# Altium footprint library mechanical.PcbLib: 44 footprints (part 2 of 3)
Each footprint in its own frame and in the unit in brackets; x right, y up, seen from the top. Pads: shape width x height; smd on the part's side, far side on the other; paste and mask are expansions set on the pad; w line width, h text height; cw(c..) or ccw(c..) is an arc to the next point about the centre after c.
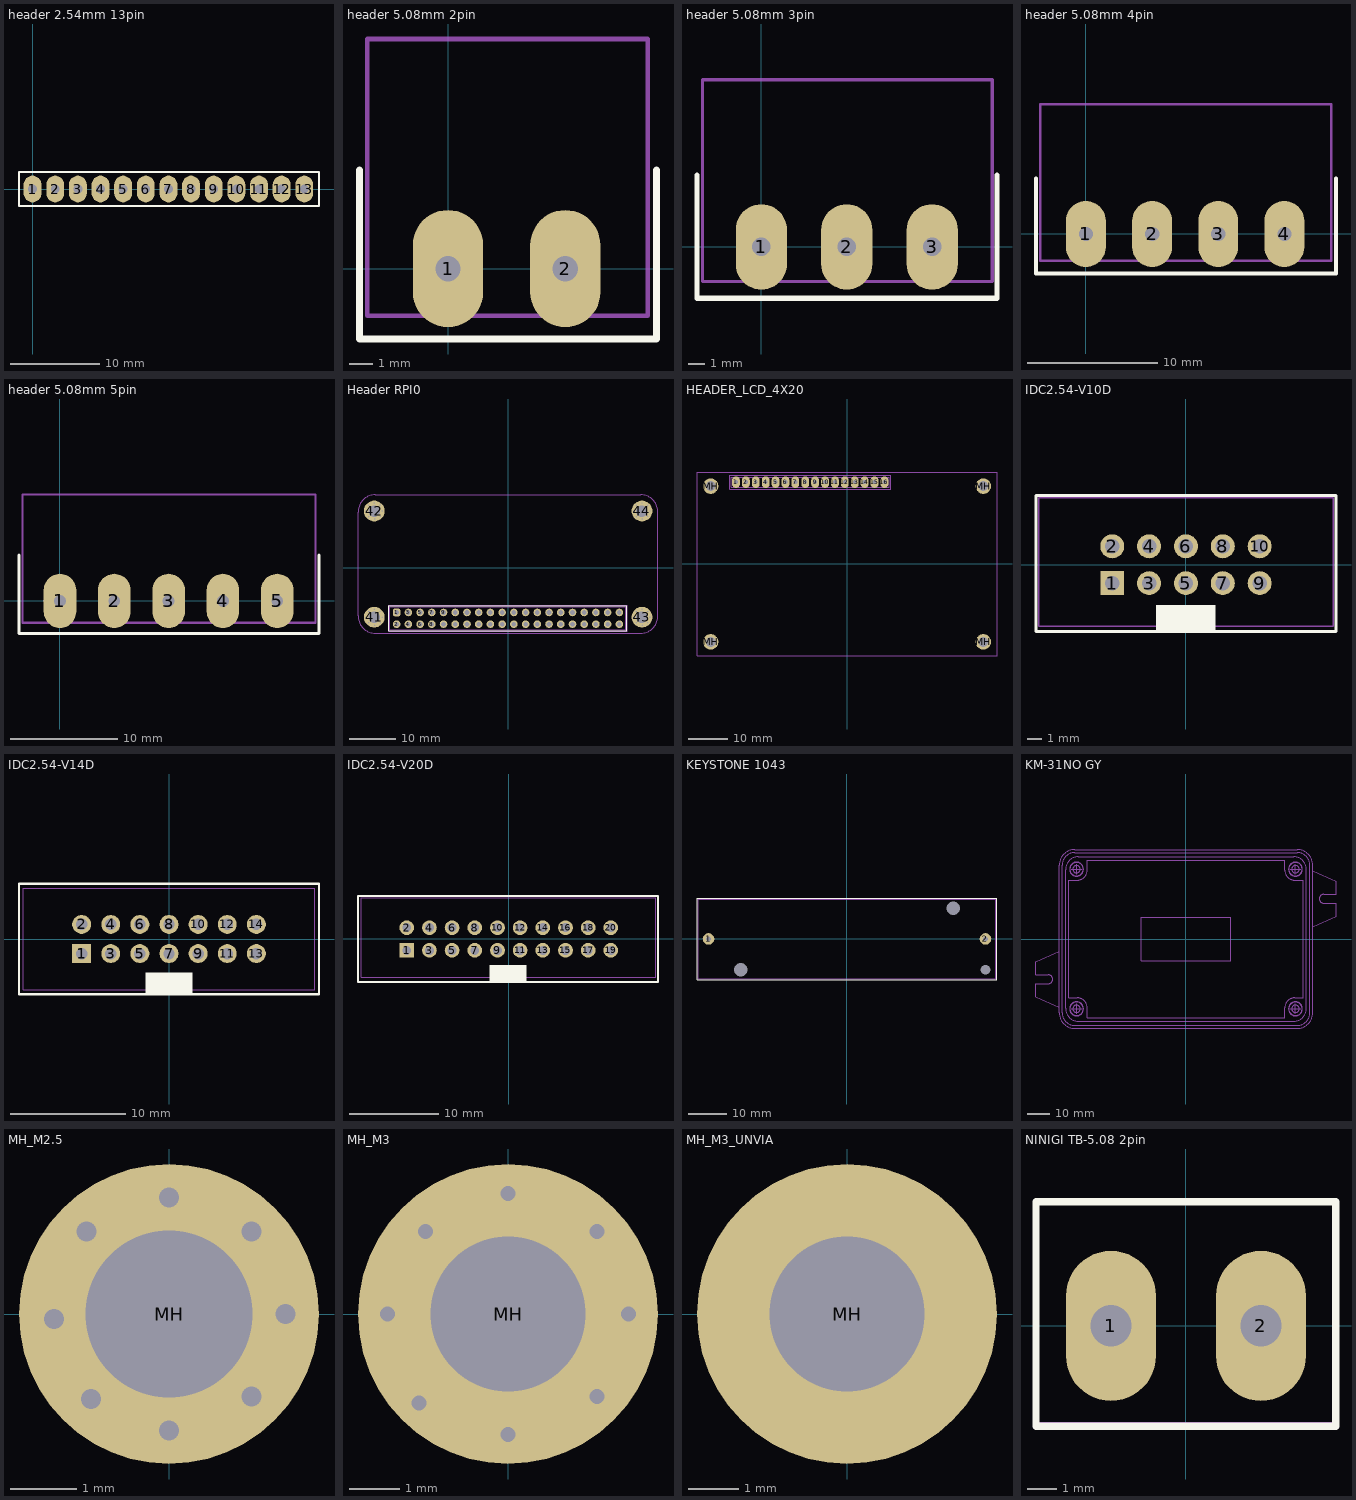
[diagram p1: the footprints below, top view; thin cyan lines are the x and y axes]

## header 2.54mm 13pin [mm]
pads (13):
  oval 2x3 hole 1: 1(0,0) 2(2.54,0) 3(5.08,0) 4(7.62,0) 5(10.16,0) 6(12.7,0) 7(15.24,0) 8(17.78,0) 9(20.32,0) 10(22.86,0) 11(25.4,0) 12(27.94,0) 13(30.48,0)
Top Overlay:
  lines w0.2: -1.524,-1.905 -1.524,1.905 32.131,1.905 32.131,-1.905 -1.524,-1.905
3D body: height 10, standoff 0, extent 29.984,-0.499 30.98,0.499
3D body: height 10, standoff 0, extent 27.444,-0.499 28.44,0.499
3D body: height 10, standoff 0, extent 24.904,-0.499 25.9,0.499
3D body: height 3, standoff 0, extent 27.305,-1.143 30.861,1.143
3D body: height 3, standoff 0, extent 25.019,-1.143 28.575,1.143
3D body: height 3, standoff 0, extent 22.225,-1.143 25.781,1.143
3D body: height 3, standoff 0, extent 29.337,-1.778 31.623,1.778
3D body: height 3, standoff 0, extent 26.797,-1.778 29.083,1.778
3D body: height 3, standoff 0, extent 24.257,-1.778 26.543,1.778
3D body: height 3, standoff 0, extent 9.525,-1.143 13.081,1.143
3D body: height 10, standoff 0, extent 12.204,-0.499 13.2,0.499
3D body: height 10, standoff 0, extent 14.744,-0.499 15.74,0.499
3D body: height 10, standoff 0, extent 17.284,-0.499 18.28,0.499
3D body: height 10, standoff 0, extent 19.824,-0.499 20.82,0.499
3D body: height 10, standoff 0, extent 22.364,-0.499 23.36,0.499
3D body: height 3, standoff 0, extent 11.557,-1.778 13.843,1.778
3D body: height 3, standoff 0, extent 14.097,-1.778 16.383,1.778
3D body: height 3, standoff 0, extent 16.637,-1.778 18.923,1.778
3D body: height 3, standoff 0, extent 19.177,-1.778 21.463,1.778
3D body: height 3, standoff 0, extent 21.717,-1.778 24.003,1.778
3D body: height 3, standoff 0, extent 12.319,-1.143 15.875,1.143
3D body: height 3, standoff 0, extent 14.605,-1.143 18.161,1.143
3D body: height 3, standoff 0, extent 17.399,-1.143 20.955,1.143
3D body: height 3, standoff 0, extent 19.685,-1.143 23.241,1.143
3D body: height 10, standoff 0, extent -0.496,-0.499 0.5,0.499
3D body: height 10, standoff 0, extent 2.044,-0.499 3.04,0.499
3D body: height 10, standoff 0, extent 4.584,-0.499 5.58,0.499
3D body: height 10, standoff 0, extent 7.124,-0.499 8.12,0.499
3D body: height 10, standoff 0, extent 9.664,-0.499 10.66,0.499
3D body: height 3, standoff 0, extent -1.143,-1.778 1.143,1.778
3D body: height 3, standoff 0, extent 1.397,-1.778 3.683,1.778
3D body: height 3, standoff 0, extent 3.937,-1.778 6.223,1.778
3D body: height 3, standoff 0, extent 6.477,-1.778 8.763,1.778
3D body: height 3, standoff 0, extent 9.017,-1.778 11.303,1.778
3D body: height 3, standoff 0, extent -0.381,-1.143 3.175,1.143
3D body: height 3, standoff 0, extent 1.905,-1.143 5.461,1.143
3D body: height 3, standoff 0, extent 4.699,-1.143 8.255,1.143
3D body: height 3, standoff 0, extent 6.985,-1.143 10.541,1.143

## header 5.08mm 2pin [mm]
height 7.8
pads (2):
  oval 3.048x5.08 hole 1.1: 1(0,0) 2(5.08,0)
Top Overlay:
  lines w0.3: -3.833,4.275 -3.833,-3.05 9.03,-3.05 9.03,4.275
Mechanical 13:
  lines w0.2: -3.503,-2.05 8.657,-2.05 8.657,9.95 -3.503,9.95 -3.503,-2.05
3D body "User Library-TB5_08-2R.step": height 8.55, standoff -4.1, extent -3.503,-2.05 8.657,9.95

## header 5.08mm 3pin [mm]
height 7.8
pads (3):
  oval 3.048x5.08 hole 1.1: 1(0,0) 2(5.08,0) 3(10.16,0)
Top Overlay:
  lines w0.254: -1.4,0 0,0 ; 10.16,0 11.56,0
  lines w0.3: -3.833,4.275 -3.833,-3.05 14.017,-3.05 14.017,4.275
Mechanical 13:
  lines w0.2: -3.503,-2.05 13.737,-2.05 13.737,9.95 -3.503,9.95 -3.503,-2.05
3D body "User Library-TB5_08-3R.step": height 8.55, standoff -4.1, extent -3.503,-2.05 13.737,9.95

## header 5.08mm 4pin [mm]
height 7.8
pads (4):
  oval 3.048x5.08 hole 1.1: 1(0,0) 2(5.08,0) 3(10.16,0) 4(15.24,0)
Top Overlay:
  lines w0.254: -1.4,0 0,0 ; 10.16,0 11.56,0
  lines w0.3: -3.833,4.275 -3.833,-3.05 19.2,-3.05 19.2,4.275
Mechanical 13:
  lines w0.2: -3.503,-2.05 -3.503,9.95 18.825,9.95 18.825,-2.05 -3.503,-2.05
3D body "User Library-TB5_08-4R.step": height 8.55, standoff -4.1, extent -3.503,-2.05 18.817,9.95

## header 5.08mm 5pin [mm]
height 7.8
pads (5):
  oval 3.048x5.08 hole 1.1: 1(0,0) 2(5.08,0) 3(10.16,0) 4(15.24,0) 5(20.32,0)
Top Overlay:
  lines w0.254: -1.4,0 0,0 ; 10.16,0 11.56,0
  lines w0.3: -3.833,4.275 -3.833,-3.05 24.225,-3.05 24.225,4.275
Mechanical 13:
  lines w0.2: -3.503,-2.05 23.897,-2.05 23.897,9.95 -3.503,9.95 -3.503,-2.05
3D body "User Library-TB5_08-5R.step": height 8.55, standoff -4.1, extent -3.503,-2.05 23.897,9.95

## Header RPI0 [mm]
height 9.45
pads (44):
  rrect50% 1.65x1.65 hole 1: 1(-24.153,-9.717)
  round 1.65 hole 1: 2(-24.153,-12.257) 3(-21.613,-9.717) 4(-21.613,-12.257) 5(-19.073,-9.717) 6(-19.073,-12.257) 7(-16.533,-9.717) 8(-16.533,-12.257) 9(-13.993,-9.717) 10(-13.993,-12.257) 11(-11.453,-9.717) 12(-11.453,-12.257) 13(-8.913,-9.717) 14(-8.913,-12.257) 15(-6.373,-9.717) 16(-6.373,-12.257) 17(-3.833,-9.717) 18(-3.833,-12.257) 19(-1.293,-9.717) 20(-1.293,-12.257) 21(1.247,-9.717) 22(1.247,-12.257) 23(3.787,-9.717) 24(3.787,-12.257) 25(6.327,-9.717) 26(6.327,-12.257) 27(8.867,-9.717) 28(8.867,-12.257) 29(11.407,-9.717) 30(11.407,-12.257) 31(13.947,-9.717) 32(13.947,-12.257) 33(16.487,-9.717) 34(16.487,-12.257) 35(19.027,-9.717) 36(19.027,-12.257) 37(21.567,-9.717) 38(21.567,-12.257) 39(24.107,-9.717) 40(24.107,-12.257)
  round 4.5 hole 2.5: 41(-29,-10.743) 42(-29,12.257) 43(29,-10.743) 44(29,12.257)
via -30.237,13.494 diameter 0.6 hole 0.3
via -27.727,11.09 diameter 0.6 hole 0.3
via -27.763,13.494 diameter 0.6 hole 0.3
via -30.237,11.019 diameter 0.6 hole 0.3
via -30.75,12.257 diameter 0.6 hole 0.3
via -27.25,12.257 diameter 0.6 hole 0.3
via -28.925,10.532 diameter 0.6 hole 0.3
via -29,14.007 diameter 0.6 hole 0.3
via 29,14.007 diameter 0.6 hole 0.3
via 29.075,10.532 diameter 0.6 hole 0.3
via 30.75,12.257 diameter 0.6 hole 0.3
via 27.25,12.257 diameter 0.6 hole 0.3
via 27.763,11.019 diameter 0.6 hole 0.3
via 30.237,13.494 diameter 0.6 hole 0.3
via 30.273,11.09 diameter 0.6 hole 0.3
via 27.763,13.494 diameter 0.6 hole 0.3
via -29,-8.993 diameter 0.6 hole 0.3
via -28.925,-12.468 diameter 0.6 hole 0.3
via -27.25,-10.743 diameter 0.6 hole 0.3
via -30.75,-10.743 diameter 0.6 hole 0.3
via -30.237,-11.981 diameter 0.6 hole 0.3
via -27.763,-9.506 diameter 0.6 hole 0.3
via -27.727,-11.91 diameter 0.6 hole 0.3
via -30.237,-9.506 diameter 0.6 hole 0.3
via 27.763,-9.506 diameter 0.6 hole 0.3
via 30.273,-11.91 diameter 0.6 hole 0.3
via 30.237,-9.506 diameter 0.6 hole 0.3
via 27.763,-11.981 diameter 0.6 hole 0.3
via 27.25,-10.743 diameter 0.6 hole 0.3
via 30.75,-10.743 diameter 0.6 hole 0.3
via 29.075,-12.468 diameter 0.6 hole 0.3
via 29,-8.993 diameter 0.6 hole 0.3
Top Overlay:
  lines w0.2: -25.823,-13.687 25.702,-13.687 25.702,-8.287 -25.823,-8.287 -25.823,-13.687
Mechanical 1:
  lines w0.1: -32.525,-10.467 ccw(c-28.775,-10.467) -28.775,-14.217 28.725,-14.217 ccw(c28.725,-10.467) 32.475,-10.467 32.475,12.033 ccw(c28.725,12.033) 28.725,15.783 -28.775,15.783 ccw(c-28.775,12.033) -32.525,12.033 -32.525,-10.467
Mechanical 13:
  lines w0.1: -25.603,-13.487 25.497,-13.487 25.497,-8.487 -25.603,-8.487 -25.603,-13.487
  text ".Value" at -0.823,-11.162 h0.5
  text ".Designator" at -25.448,-8.187 h0.5
Mechanical 15:
  lines w0.1: -25.905,-13.787 25.761,-13.787 25.799,-8.187 -25.866,-8.187 -25.905,-13.787
3D body "User Library-Header 2x20 2_54mm.step": height 8.5, standoff -2.6, extent -25.603,-13.512 25.497,-8.512

## HEADER_LCD_4X20 [mm]
height 8
pads (20):
  oval 2x3 hole 1: 1(-28.5,21) 2(-25.96,21) 3(-23.42,21) 4(-20.88,21) 5(-18.34,21) 6(-15.8,21) 7(-13.26,21) 8(-10.72,21) 9(-8.18,21) 10(-5.64,21) 11(-3.1,21) 12(-0.56,21) 13(1.98,21) 14(4.52,21) 15(7.06,21) 16(9.6,21)
  round 4 hole 2.5: MH(-35,-20) MH(-35,20) MH(35,-20) MH(35,20)
Mechanical 13:
  lines w0.2: -38.5,-23.5 -38.5,23.5 38.5,23.5 38.5,-23.5 -38.5,-23.5 ; -29.738,19.754 10.902,19.754 10.902,22.294 -29.738,22.294 -29.738,19.754
  text ".Designator" at -29.748,22.788 h0.5
  text ".Value" at -10.25,18.55 h0.5
Mechanical 15:
  lines w0.2: -30.038,19.2 -30.038,22.8 11.202,22.8 11.202,19.2 -30.038,19.2
3D body "65793.stp": height 8.57, standoff -2.97, extent -9.418,19.754 10.902,22.294
3D body "65793.stp": height 8.57, standoff -2.97, extent -29.738,19.754 -9.418,22.294

## IDC2.54-V10D [mm]
height 9.45
pads (10):
  rect 1.65x1.65 hole 1: 1(-5.08,-1.27)
  round 1.65 hole 1: 2(-5.08,1.27) 3(-2.54,-1.27) 4(-2.54,1.27) 5(0,-1.27) 6(0,1.27) 7(2.54,-1.27) 8(2.54,1.27) 9(5.08,-1.27) 10(5.08,1.27)
Top Overlay:
  rectangle: -2.05,-4.675 2.05,-2.775
  lines w0.2: -10.335,-4.6 -10.335,4.775 10.34,4.775 10.34,-4.6 -10.335,-4.6
Mechanical 13:
  lines w0.1: -10.135,-4.25 10.165,-4.25 10.165,4.6 -10.135,4.6 -10.135,-4.25
3D body "User Library-IDC Socket Male 10pin Straight THT Goldplated 2_54mm.step": height 8.93, standoff -3.47, extent -10.135,-4.25 10.165,4.6

## IDC2.54-V14D [mm] "Connector; IDC, Low Profile Male Header, Thru-Hole; 14 Position; Vertical; Pitch 2.54 mm; Body 25.40 x 9.2 x 9.45 mm (LxWxH)"
height 9.45
pads (14):
  rect 1.65x1.65 hole 1: 1(-7.62,-1.27)
  round 1.65 hole 1: 2(-7.62,1.27) 3(-5.08,-1.27) 4(-5.08,1.27) 5(-2.54,-1.27) 6(-2.54,1.27) 7(0,-1.27) 8(0,1.27) 9(2.54,-1.27) 10(2.54,1.27) 11(5.08,-1.27) 12(5.08,1.27) 13(7.62,-1.27) 14(7.62,1.27)
Top Overlay:
  rectangle: -2.032,-4.826 2.068,-2.926
  lines w0.2: -13.081,-4.826 13.081,-4.826 13.081,4.826 -13.081,4.826 -13.081,-4.826
Mechanical 13:
  lines w0.1: -12.7,-4.445 -12.7,4.445 12.7,4.445 12.7,-4.445 -12.7,-4.445
3D body "User Library-IDC Socket Male 14pin Straight THT Goldplated 2_54mm.STEP": height 8.93, standoff -3.47, extent -12.69,-4.405 12.69,4.445

## IDC2.54-V20D [mm] "Connector; IDC, Low Profile Male Header, Thru-Hole; 14 Position; Vertical; Pitch 2.54 mm; Body 25.40 x 9.2 x 9.45 mm (LxWxH)"
height 9.45
pads (20):
  rect 1.65x1.65 hole 1: 1(-11.43,-1.27)
  round 1.65 hole 1: 2(-11.43,1.27) 3(-8.89,-1.27) 4(-8.89,1.27) 5(-6.35,-1.27) 6(-6.35,1.27) 7(-3.81,-1.27) 8(-3.81,1.27) 9(-1.27,-1.27) 10(-1.27,1.27) 11(1.27,-1.27) 12(1.27,1.27) 13(3.81,-1.27) 14(3.81,1.27) 15(6.35,-1.27) 16(6.35,1.27) 17(8.89,-1.27) 18(8.89,1.27) 19(11.43,-1.27) 20(11.43,1.27)
Top Overlay:
  rectangle: -2.138,-4.826 1.962,-2.926
  lines w0.2: -16.891,-4.826 -16.891,4.826 16.715,4.826 16.715,-4.826 -16.891,-4.826
Mechanical 13:
  lines w0.1: -16.5,-4.3 16.475,-4.3 16.475,4.6 -16.5,4.6 -16.5,-4.3
3D body "User Library-IDC Socket Male 20pin Straight THT Goldplated 2_54mm.step": height 8.93, standoff -3.47, extent -16.5,-4.25 16.5,4.6

## KEYSTONE 1043 [mm]
height 21
pads (5):
  round 3 / inner round 1.524 / far side round 1.524 hole 1.3: 1(-35.82,0)
  round 3 hole 1.3: 2(35.82,0)
  round 0 hole 3.5 unplated: MH9(-27.54,-8) MH9(27.54,8)
  round 0 hole 2.5 unplated: MH9(35.82,-8)
Top Overlay:
  lines w0.254: -38.798,-10.575 38.802,-10.575 38.802,10.55 -38.798,10.55 -38.798,-10.575
Mechanical 13:
  lines w0.1: -38.525,-10.325 38.529,-10.325 38.529,10.325 -38.525,10.325 -38.525,-10.325
3D body "keystone-PN1043.STEP": height 14.86, standoff -3.56, extent -38.525,-10.325 38.529,10.325

## KM-31NO GY [mm]
height 32
Mechanical 2:
  circle w0.1: c49,-31.225 r3.142
  circle w0.1: c49,-31.225 r2.993
  circle w0.1: c-48.98,-31.225 r3.142
  circle w0.1: c-48.98,-31.225 r2.993
  circle w0.1: c49.01,31.275 r1.65
  circle w0.1: c49,31.275 r2.993
  circle w0.1: c49,31.275 r3.142
  circle w0.1: c-49,31.275 r3.142
  circle w0.1: c-49,31.275 r2.993
  circle w0.1: c-48.99,31.275 r1.65
  circle w0.1: c49.01,-31.225 r1.65
  circle w0.1: c-48.99,-31.225 r1.65
  lines w0.1: -56.74,-30.475 -67.14,-25.725 -67.14,-19.975 -61.64,-19.975 ccw(c-61.63,-17.975) -61.64,-15.975 -67.14,-15.975 -67.14,-10.225 -56.74,-5.475 ; -56.74,-30.475 -56.74,-5.475 ; -56.74,-30.475 -56.74,-32.975 ccw(c-49.74,-32.975) -49.74,-39.975 49.76,-39.975 ccw(c49.76,-32.975) 56.76,-32.975 56.76,5.525 ; -56.74,-5.475 -56.74,33.025 cw(c-49.74,33.025) -49.74,40.025 49.76,40.025 cw(c49.76,33.025) 56.76,33.025 56.76,30.525 ; 56.76,5.525 67.16,10.275 67.16,16.025 61.66,16.025 cw(c61.65,18.025) 61.66,20.025 67.16,20.025 67.16,25.775 56.76,30.525 ; 56.76,5.525 56.76,30.525 ; -55.44,-32.975 ccw(c-49.74,-32.975) -49.74,-38.675 49.76,-38.675 ccw(c49.76,-32.975) 55.46,-32.975 55.46,33.025 ccw(c49.76,33.025) 49.76,38.725 -49.74,38.725 ccw(c-49.74,33.025) -55.44,33.025 -55.44,-32.975 ; -53.89,-31.075 ccw(c-48.19,-31.075) -48.19,-36.775 48.21,-36.775 ccw(c48.21,-31.075) 53.91,-31.075 53.91,31.125 ccw(c48.21,31.125) 48.21,36.825 -48.19,36.825 ccw(c-48.19,31.125) -53.89,31.125 -53.89,-31.075 ; -52.39,-26.275 -48.74,-26.275 cw(c-48.74,-30.775) -44.24,-30.775 -44.24,-35.275 44.26,-35.275 44.26,-30.775 cw(c48.76,-30.775) 48.76,-26.275 52.41,-26.275 52.41,26.325 48.76,26.325 cw(c48.76,30.825) 44.26,30.825 44.26,35.325 -44.24,35.325 -44.24,30.825 cw(c-48.74,30.825) -48.74,26.325 -52.39,26.325 -52.39,-26.275 ; -20.09,-9.625 20.11,-9.625 20.11,9.675 -20.09,9.675 -20.09,-9.625
Mechanical 3:
Mechanical 8:
  lines w0.1: -51.276,-31.225 -46.704,-31.225 ; -51.276,31.275 -46.704,31.275 ; -48.99,-33.511 -48.99,-28.939 ; -48.99,28.989 -48.99,33.561 ; 46.724,-31.225 51.296,-31.225 ; 46.724,31.275 51.296,31.275 ; 49.01,-33.511 49.01,-28.939 ; 49.01,28.989 49.01,33.561
3D body "km-31.step": height 29.5, standoff 0, extent -56.74,-39.975 56.76,40.025
3D body "km-31_podstawka.step": height 3.2, standoff -3.6, extent -67.14,-39.969 67.16,40.031

## MH_M2.5 [mm] "M2.5"
pads (1):
  round 4.5 hole 2.5: MH(0,0)
via 1.75,0 diameter 0.6 hole 0.3
via -1.725,-0.075 diameter 0.6 hole 0.3
via 0,-1.75 diameter 0.6 hole 0.3
via 0,1.75 diameter 0.6 hole 0.3
via -1.237,1.237 diameter 0.6 hole 0.3
via 1.237,-1.237 diameter 0.6 hole 0.3
via -1.167,-1.273 diameter 0.6 hole 0.3
via 1.237,1.237 diameter 0.6 hole 0.3

## MH_M3 [mm] "M3 3mm hole"
pads (1):
  round 6 hole 3.1: MH(0,0)
via 0,2.413 diameter 0.6 hole 0.3
via -1.651,1.651 diameter 0.6 hole 0.3
via -2.413,0 diameter 0.6 hole 0.3
via -1.778,-1.778 diameter 0.6 hole 0.3
via 0,-2.413 diameter 0.6 hole 0.3
via 1.778,-1.651 diameter 0.6 hole 0.3
via 2.413,0 diameter 0.6 hole 0.3
via 1.778,1.651 diameter 0.6 hole 0.3

## MH_M3_UNVIA [mm] "M3 3mm hole"
pads (1):
  round 6 hole 3.1: MH(0,0)

## NINIGI TB-5.08 2pin [mm] "NINIGI TB-5.08-P-2P/BL"
height 10
pads (2):
  oval 3.048x5.08 hole 1.4: 1(-2.54,0) 2(2.54,0)
Top Overlay:
  lines w0.254: -5.08,-3.4 5.08,-3.4 5.08,4.2 -5.08,4.2 -5.08,-3.4
Mechanical 13:
  lines w0.1: -5.08,-3.3 -5.08,4.2 5.08,4.2 5.08,-3.3 -5.08,-3.3
  text ".Designator" at -5.094,4.518 h0.5
  text ".Value" at -0.95,0.3 h0.5
3D body "User Library-Terminal block 2 POS.STEP": height 10, standoff -3.05, extent -5.08,-3.3 5.08,4.2